# Altium footprint library ref-packages.PCBLIB: 1544 footprints (part 74 of 103)
Each footprint in its own frame and in the unit in brackets; x right, y up, seen from the top. Pads: shape width x height; smd on the part's side, far side on the other; paste and mask are expansions set on the pad; w line width, h text height; cw(c..) or ccw(c..) is an arc to the next point about the centre after c.
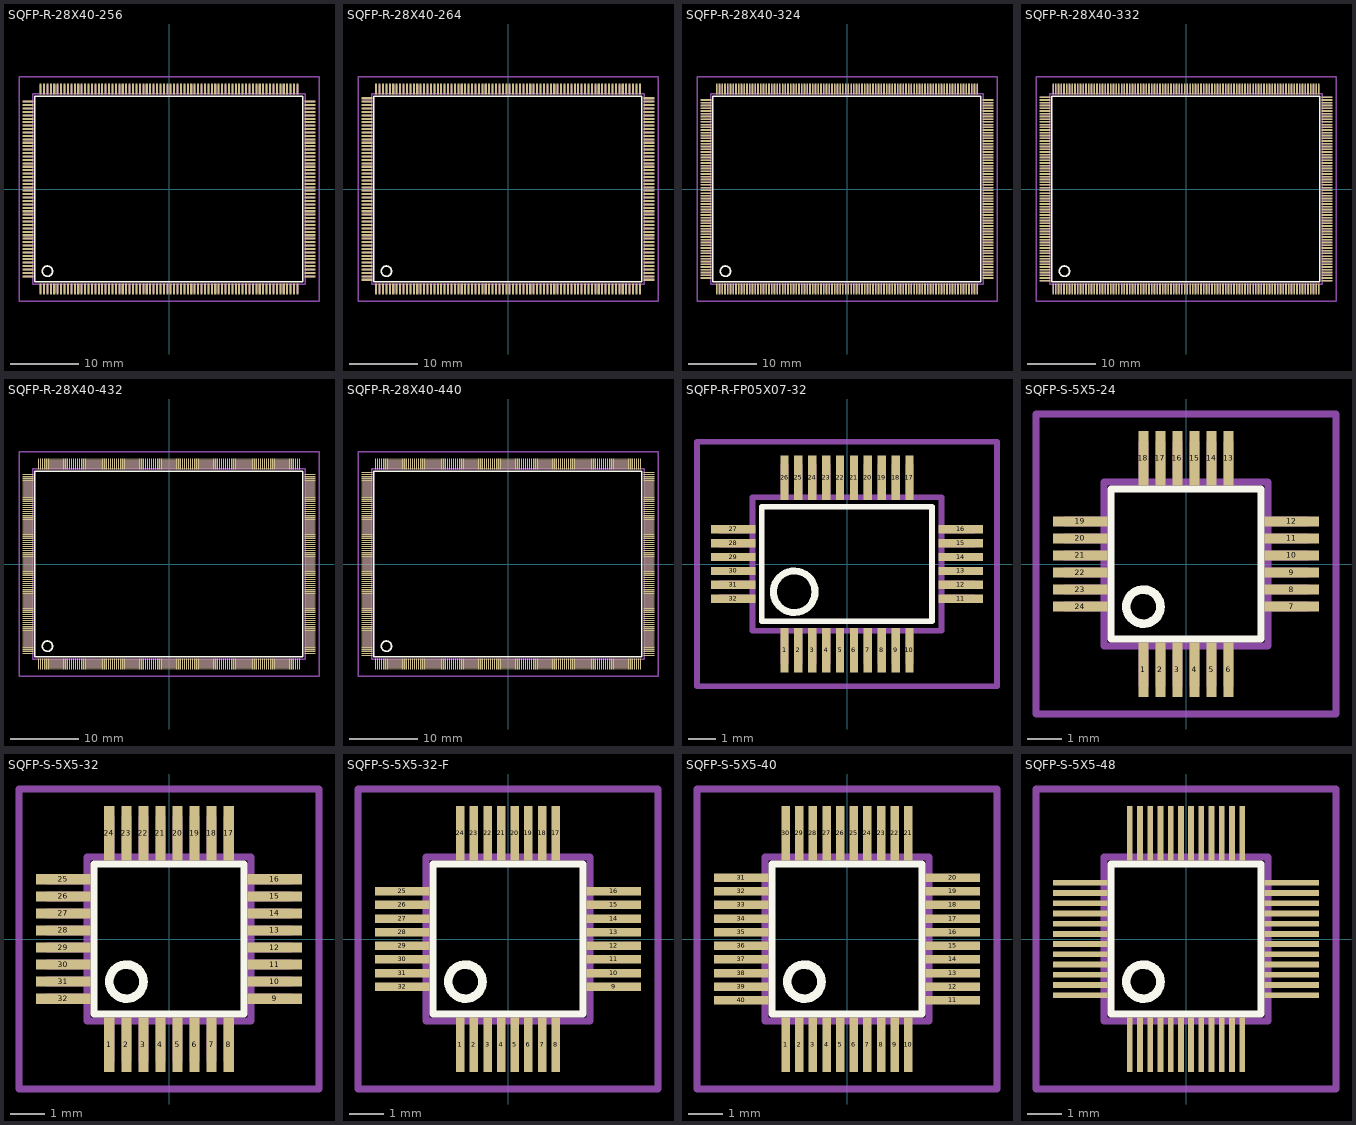
[diagram p73: the footprints below, top view; thin cyan lines are the x and y axes]

## SQFP-R-28X40-256 [mil]
pads (256):
  rect 11.81x62.99 smd: 1(-738.19,-574.8) 2(-718.5,-574.8) 3(-698.82,-574.8) 4(-679.13,-574.8) 5(-659.45,-574.8) 6(-639.76,-574.8) 7(-620.08,-574.8) 8(-600.39,-574.8) 9(-580.71,-574.8) 10(-561.02,-574.8) 11(-541.34,-574.8) 12(-521.65,-574.8) 13(-501.97,-574.8) 14(-482.28,-574.8) 15(-462.6,-574.8) 16(-442.91,-574.8) 17(-423.23,-574.8) 18(-403.54,-574.8) 19(-383.86,-574.8) 20(-364.17,-574.8) 21(-344.49,-574.8) 22(-324.8,-574.8) 23(-305.12,-574.8) 24(-285.43,-574.8) 25(-265.75,-574.8) 26(-246.06,-574.8) 27(-226.38,-574.8) 28(-206.69,-574.8) 29(-187.01,-574.8) 30(-167.32,-574.8) 31(-147.64,-574.8) 32(-127.95,-574.8) 33(-108.27,-574.8) 34(-88.58,-574.8) 35(-68.9,-574.8) 36(-49.21,-574.8) 37(-29.53,-574.8) 38(-9.84,-574.8) 39(9.84,-574.8) 40(29.53,-574.8) 41(49.21,-574.8) 42(68.9,-574.8) 43(88.58,-574.8) 44(108.27,-574.8) 45(127.95,-574.8) 46(147.64,-574.8) 47(167.32,-574.8) 48(187.01,-574.8) 49(206.69,-574.8) 50(226.38,-574.8) 51(246.06,-574.8) 52(265.75,-574.8) 53(285.43,-574.8) 54(305.12,-574.8) 55(324.8,-574.8) 56(344.49,-574.8) 57(364.17,-574.8) 58(383.86,-574.8) 59(403.54,-574.8) 60(423.23,-574.8) 61(442.91,-574.8) 62(462.6,-574.8) 63(482.28,-574.8) 64(501.97,-574.8) 65(521.65,-574.8) 66(541.34,-574.8) 67(561.02,-574.8) 68(580.71,-574.8) 69(600.39,-574.8) 70(620.08,-574.8) 71(639.76,-574.8) 72(659.45,-574.8) 73(679.13,-574.8) 74(698.82,-574.8) 75(718.5,-574.8) 76(738.19,-574.8) 129(738.19,574.8) 130(718.5,574.8) 131(698.82,574.8) 132(679.13,574.8) 133(659.45,574.8) 134(639.76,574.8) 135(620.08,574.8) 136(600.39,574.8) 137(580.71,574.8) 138(561.02,574.8) 139(541.34,574.8) 140(521.65,574.8) 141(501.97,574.8) 142(482.28,574.8) 143(462.6,574.8) 144(442.91,574.8) 145(423.23,574.8) 146(403.54,574.8) 147(383.86,574.8) 148(364.17,574.8) 149(344.49,574.8) 150(324.8,574.8) 151(305.12,574.8) 152(285.43,574.8) 153(265.75,574.8) 154(246.06,574.8) 155(226.38,574.8) 156(206.69,574.8) 157(187.01,574.8) 158(167.32,574.8) 159(147.64,574.8) 160(127.95,574.8) 161(108.27,574.8) 162(88.58,574.8) 163(68.9,574.8) 164(49.21,574.8) 165(29.53,574.8) 166(9.84,574.8) 167(-9.84,574.8) 168(-29.53,574.8) 169(-49.21,574.8) 170(-68.9,574.8) 171(-88.58,574.8) 172(-108.27,574.8) 173(-127.95,574.8) 174(-147.64,574.8) 175(-167.32,574.8) 176(-187.01,574.8) 177(-206.69,574.8) 178(-226.38,574.8) 179(-246.06,574.8) 180(-265.75,574.8) 181(-285.43,574.8) 182(-305.12,574.8) 183(-324.8,574.8) 184(-344.49,574.8) 185(-364.17,574.8) 186(-383.86,574.8) 187(-403.54,574.8) 188(-423.23,574.8) 189(-442.91,574.8) 190(-462.6,574.8) 191(-482.28,574.8) 192(-501.97,574.8) 193(-521.65,574.8) 194(-541.34,574.8) 195(-561.02,574.8) 196(-580.71,574.8) 197(-600.39,574.8) 198(-620.08,574.8) 199(-639.76,574.8) 200(-659.45,574.8) 201(-679.13,574.8) 202(-698.82,574.8) 203(-718.5,574.8) 204(-738.19,574.8)
  rect 62.99x11.81 smd: 77(811.02,-501.97) 78(811.02,-482.28) 79(811.02,-462.6) 80(811.02,-442.91) 81(811.02,-423.23) 82(811.02,-403.54) 83(811.02,-383.86) 84(811.02,-364.17) 85(811.02,-344.49) 86(811.02,-324.8) 87(811.02,-305.12) 88(811.02,-285.43) 89(811.02,-265.75) 90(811.02,-246.06) 91(811.02,-226.38) 92(811.02,-206.69) 93(811.02,-187.01) 94(811.02,-167.32) 95(811.02,-147.64) 96(811.02,-127.95) 97(811.02,-108.27) 98(811.02,-88.58) 99(811.02,-68.9) 100(811.02,-49.21) 101(811.02,-29.53) 102(811.02,-9.84) 103(811.02,9.84) 104(811.02,29.53) 105(811.02,49.21) 106(811.02,68.9) 107(811.02,88.58) 108(811.02,108.27) 109(811.02,127.95) 110(811.02,147.64) 111(811.02,167.32) 112(811.02,187.01) 113(811.02,206.69) 114(811.02,226.38) 115(811.02,246.06) 116(811.02,265.75) 117(811.02,285.43) 118(811.02,305.12) 119(811.02,324.8) 120(811.02,344.49) 121(811.02,364.17) 122(811.02,383.86) 123(811.02,403.54) 124(811.02,423.23) 125(811.02,442.91) 126(811.02,462.6) 127(811.02,482.28) 128(811.02,501.97) 205(-811.02,501.97) 206(-811.02,482.28) 207(-811.02,462.6) 208(-811.02,442.91) 209(-811.02,423.23) 210(-811.02,403.54) 211(-811.02,383.86) 212(-811.02,364.17) 213(-811.02,344.49) 214(-811.02,324.8) 215(-811.02,305.12) 216(-811.02,285.43) 217(-811.02,265.75) 218(-811.02,246.06) 219(-811.02,226.38) 220(-811.02,206.69) 221(-811.02,187.01) 222(-811.02,167.32) 223(-811.02,147.64) 224(-811.02,127.95) 225(-811.02,108.27) 226(-811.02,88.58) 227(-811.02,68.9) 228(-811.02,49.21) 229(-811.02,29.53) 230(-811.02,9.84) 231(-811.02,-9.84) 232(-811.02,-29.53) 233(-811.02,-49.21) 234(-811.02,-68.9) 235(-811.02,-88.58) 236(-811.02,-108.27) 237(-811.02,-127.95) 238(-811.02,-147.64) 239(-811.02,-167.32) 240(-811.02,-187.01) 241(-811.02,-206.69) 242(-811.02,-226.38) 243(-811.02,-246.06) 244(-811.02,-265.75) 245(-811.02,-285.43) 246(-811.02,-305.12) 247(-811.02,-324.8) 248(-811.02,-344.49) 249(-811.02,-364.17) 250(-811.02,-383.86) 251(-811.02,-403.54) 252(-811.02,-423.23) 253(-811.02,-442.91) 254(-811.02,-462.6) 255(-811.02,-482.28) 256(-811.02,-501.97)
Top Overlay:
  circle w10: c-698.82,-472.44 r29.53
  lines w8: -770.47,-533.86 770.08,-533.86 770.08,533.86 -770.47,533.86 -770.47,-533.86
Mechanical 16:
  drawing of 260 lines, arcs and shapes, not listed
Mechanical 27:
  lines w7.87: -862.2,-645.67 -862.2,645.67 862.2,645.67 862.2,-645.67 -862.2,-645.67

## SQFP-R-28X40-264 [mil]
pads (264):
  rect 11.81x62.99 smd: 1(-757.87,-574.8) 2(-738.19,-574.8) 3(-718.5,-574.8) 4(-698.82,-574.8) 5(-679.13,-574.8) 6(-659.45,-574.8) 7(-639.76,-574.8) 8(-620.08,-574.8) 9(-600.39,-574.8) 10(-580.71,-574.8) 11(-561.02,-574.8) 12(-541.34,-574.8) 13(-521.65,-574.8) 14(-501.97,-574.8) 15(-482.28,-574.8) 16(-462.6,-574.8) 17(-442.91,-574.8) 18(-423.23,-574.8) 19(-403.54,-574.8) 20(-383.86,-574.8) 21(-364.17,-574.8) 22(-344.49,-574.8) 23(-324.8,-574.8) 24(-305.12,-574.8) 25(-285.43,-574.8) 26(-265.75,-574.8) 27(-246.06,-574.8) 28(-226.38,-574.8) 29(-206.69,-574.8) 30(-187.01,-574.8) 31(-167.32,-574.8) 32(-147.64,-574.8) 33(-127.95,-574.8) 34(-108.27,-574.8) 35(-88.58,-574.8) 36(-68.9,-574.8) 37(-49.21,-574.8) 38(-29.53,-574.8) 39(-9.84,-574.8) 40(9.84,-574.8) 41(29.53,-574.8) 42(49.21,-574.8) 43(68.9,-574.8) 44(88.58,-574.8) 45(108.27,-574.8) 46(127.95,-574.8) 47(147.64,-574.8) 48(167.32,-574.8) 49(187.01,-574.8) 50(206.69,-574.8) 51(226.38,-574.8) 52(246.06,-574.8) 53(265.75,-574.8) 54(285.43,-574.8) 55(305.12,-574.8) 56(324.8,-574.8) 57(344.49,-574.8) 58(364.17,-574.8) 59(383.86,-574.8) 60(403.54,-574.8) 61(423.23,-574.8) 62(442.91,-574.8) 63(462.6,-574.8) 64(482.28,-574.8) 65(501.97,-574.8) 66(521.65,-574.8) 67(541.34,-574.8) 68(561.02,-574.8) 69(580.71,-574.8) 70(600.39,-574.8) 71(620.08,-574.8) 72(639.76,-574.8) 73(659.45,-574.8) 74(679.13,-574.8) 75(698.82,-574.8) 76(718.5,-574.8) 77(738.19,-574.8) 78(757.87,-574.8) 133(757.87,574.8) 134(738.19,574.8) 135(718.5,574.8) 136(698.82,574.8) 137(679.13,574.8) 138(659.45,574.8) 139(639.76,574.8) 140(620.08,574.8) 141(600.39,574.8) 142(580.71,574.8) 143(561.02,574.8) 144(541.34,574.8) 145(521.65,574.8) 146(501.97,574.8) 147(482.28,574.8) 148(462.6,574.8) 149(442.91,574.8) 150(423.23,574.8) 151(403.54,574.8) 152(383.86,574.8) 153(364.17,574.8) 154(344.49,574.8) 155(324.8,574.8) 156(305.12,574.8) 157(285.43,574.8) 158(265.75,574.8) 159(246.06,574.8) 160(226.38,574.8) 161(206.69,574.8) 162(187.01,574.8) 163(167.32,574.8) 164(147.64,574.8) 165(127.95,574.8) 166(108.27,574.8) 167(88.58,574.8) 168(68.9,574.8) 169(49.21,574.8) 170(29.53,574.8) 171(9.84,574.8) 172(-9.84,574.8) 173(-29.53,574.8) 174(-49.21,574.8) 175(-68.9,574.8) 176(-88.58,574.8) 177(-108.27,574.8) 178(-127.95,574.8) 179(-147.64,574.8) 180(-167.32,574.8) 181(-187.01,574.8) 182(-206.69,574.8) 183(-226.38,574.8) 184(-246.06,574.8) 185(-265.75,574.8) 186(-285.43,574.8) 187(-305.12,574.8) 188(-324.8,574.8) 189(-344.49,574.8) 190(-364.17,574.8) 191(-383.86,574.8) 192(-403.54,574.8) 193(-423.23,574.8) 194(-442.91,574.8) 195(-462.6,574.8) 196(-482.28,574.8) 197(-501.97,574.8) 198(-521.65,574.8) 199(-541.34,574.8) 200(-561.02,574.8) 201(-580.71,574.8) 202(-600.39,574.8) 203(-620.08,574.8) 204(-639.76,574.8) 205(-659.45,574.8) 206(-679.13,574.8) 207(-698.82,574.8) 208(-718.5,574.8) 209(-738.19,574.8) 210(-757.87,574.8)
  rect 62.99x11.81 smd: 79(811.02,-521.65) 80(811.02,-501.97) 81(811.02,-482.28) 82(811.02,-462.6) 83(811.02,-442.91) 84(811.02,-423.23) 85(811.02,-403.54) 86(811.02,-383.86) 87(811.02,-364.17) 88(811.02,-344.49) 89(811.02,-324.8) 90(811.02,-305.12) 91(811.02,-285.43) 92(811.02,-265.75) 93(811.02,-246.06) 94(811.02,-226.38) 95(811.02,-206.69) 96(811.02,-187.01) 97(811.02,-167.32) 98(811.02,-147.64) 99(811.02,-127.95) 100(811.02,-108.27) 101(811.02,-88.58) 102(811.02,-68.9) 103(811.02,-49.21) 104(811.02,-29.53) 105(811.02,-9.84) 106(811.02,9.84) 107(811.02,29.53) 108(811.02,49.21) 109(811.02,68.9) 110(811.02,88.58) 111(811.02,108.27) 112(811.02,127.95) 113(811.02,147.64) 114(811.02,167.32) 115(811.02,187.01) 116(811.02,206.69) 117(811.02,226.38) 118(811.02,246.06) 119(811.02,265.75) 120(811.02,285.43) 121(811.02,305.12) 122(811.02,324.8) 123(811.02,344.49) 124(811.02,364.17) 125(811.02,383.86) 126(811.02,403.54) 127(811.02,423.23) 128(811.02,442.91) 129(811.02,462.6) 130(811.02,482.28) 131(811.02,501.97) 132(811.02,521.65) 211(-811.02,521.65) 212(-811.02,501.97) 213(-811.02,482.28) 214(-811.02,462.6) 215(-811.02,442.91) 216(-811.02,423.23) 217(-811.02,403.54) 218(-811.02,383.86) 219(-811.02,364.17) 220(-811.02,344.49) 221(-811.02,324.8) 222(-811.02,305.12) 223(-811.02,285.43) 224(-811.02,265.75) 225(-811.02,246.06) 226(-811.02,226.38) 227(-811.02,206.69) 228(-811.02,187.01) 229(-811.02,167.32) 230(-811.02,147.64) 231(-811.02,127.95) 232(-811.02,108.27) 233(-811.02,88.58) 234(-811.02,68.9) 235(-811.02,49.21) 236(-811.02,29.53) 237(-811.02,9.84) 238(-811.02,-9.84) 239(-811.02,-29.53) 240(-811.02,-49.21) 241(-811.02,-68.9) 242(-811.02,-88.58) 243(-811.02,-108.27) 244(-811.02,-127.95) 245(-811.02,-147.64) 246(-811.02,-167.32) 247(-811.02,-187.01) 248(-811.02,-206.69) 249(-811.02,-226.38) 250(-811.02,-246.06) 251(-811.02,-265.75) 252(-811.02,-285.43) 253(-811.02,-305.12) 254(-811.02,-324.8) 255(-811.02,-344.49) 256(-811.02,-364.17) 257(-811.02,-383.86) 258(-811.02,-403.54) 259(-811.02,-423.23) 260(-811.02,-442.91) 261(-811.02,-462.6) 262(-811.02,-482.28) 263(-811.02,-501.97) 264(-811.02,-521.65)
Top Overlay:
  circle w10: c-698.82,-472.44 r29.53
  lines w8: -770.47,-533.86 770.08,-533.86 770.08,533.86 -770.47,533.86 -770.47,-533.86
Mechanical 16:
  drawing of 268 lines, arcs and shapes, not listed
Mechanical 27:
  lines w7.87: -862.2,-645.67 -862.2,645.67 862.2,645.67 862.2,-645.67 -862.2,-645.67

## SQFP-R-28X40-324 [mm]
pads (324):
  rect 0.25x1.6 smd: 1(-19,-14.6) 2(-18.6,-14.6) 3(-18.2,-14.6) 4(-17.8,-14.6) 5(-17.4,-14.6) 6(-17,-14.6) 7(-16.6,-14.6) 8(-16.2,-14.6) 9(-15.8,-14.6) 10(-15.4,-14.6) 11(-15,-14.6) 12(-14.6,-14.6) 13(-14.2,-14.6) 14(-13.8,-14.6) 15(-13.4,-14.6) 16(-13,-14.6) 17(-12.6,-14.6) 18(-12.2,-14.6) 19(-11.8,-14.6) 20(-11.4,-14.6) 21(-11,-14.6) 22(-10.6,-14.6) 23(-10.2,-14.6) 24(-9.8,-14.6) 25(-9.4,-14.6) 26(-9,-14.6) 27(-8.6,-14.6) 28(-8.2,-14.6) 29(-7.8,-14.6) 30(-7.4,-14.6) 31(-4.6,-14.6) 32(-7,-14.6) 33(-6.6,-14.6) 34(-6.2,-14.6) 35(-5.8,-14.6) 36(-5.4,-14.6) 37(-5,-14.6) 38(-4.2,-14.6) 39(-3.8,-14.6) 40(-3.4,-14.6) 41(-3,-14.6) 42(-2.6,-14.6) 43(-2.2,-14.6) 44(-1.8,-14.6) 45(-1.4,-14.6) 46(-1,-14.6) 47(-0.6,-14.6) 48(-0.2,-14.6) 49(0.2,-14.6) 50(0.6,-14.6) 51(1,-14.6) 52(1.4,-14.6) 53(1.8,-14.6) 54(2.2,-14.6) 55(2.6,-14.6) 56(3,-14.6) 57(3.4,-14.6) 58(3.8,-14.6) 59(4.2,-14.6) 60(4.6,-14.6) 61(5,-14.6) 62(5.4,-14.6) 63(5.8,-14.6) 64(6.2,-14.6) 65(6.6,-14.6) 66(7,-14.6) 67(7.4,-14.6) 68(7.8,-14.6) 69(8.2,-14.6) 70(8.6,-14.6) 71(9,-14.6) 72(9.4,-14.6) 73(9.8,-14.6) 74(10.2,-14.6) 75(10.6,-14.6) 76(11,-14.6) 77(11.4,-14.6) 78(11.8,-14.6) 79(12.2,-14.6) 80(12.6,-14.6) 81(13,-14.6) 82(13.4,-14.6) 83(13.8,-14.6) 84(14.2,-14.6) 85(14.6,-14.6) 86(15,-14.6) 87(15.4,-14.6) 88(15.8,-14.6) 89(16.2,-14.6) 90(16.6,-14.6) 91(17,-14.6) 92(17.4,-14.6) 93(17.8,-14.6) 94(18.2,-14.6) 95(18.6,-14.6) 96(19,-14.6) 163(19,14.6) 164(18.6,14.6) 165(18.2,14.6) 166(17.8,14.6) 167(17.4,14.6) 168(17,14.6) 169(16.6,14.6) 170(16.2,14.6) 171(15.8,14.6) 172(15.4,14.6) 173(15,14.6) 174(14.6,14.6) 175(14.2,14.6) 176(13.8,14.6) 177(13.4,14.6) 178(13,14.6) 179(12.6,14.6) 180(12.2,14.6) 181(11.8,14.6) 182(11.4,14.6) 183(11,14.6) 184(10.6,14.6) 185(10.2,14.6) 186(9.8,14.6) 187(9.4,14.6) 188(9,14.6) 189(8.6,14.6) 190(8.2,14.6) 191(7.8,14.6) 192(7.4,14.6) 193(7,14.6) 194(6.6,14.6) 195(6.2,14.6) 196(5.8,14.6) 197(5.4,14.6) 198(5,14.6) 199(4.6,14.6) 200(4.2,14.6) 201(3.8,14.6) 202(3.4,14.6) 203(3,14.6) 204(2.6,14.6) 205(2.2,14.6) 206(1.8,14.6) 207(1.4,14.6) 208(1,14.6) 209(0.6,14.6) 210(0.2,14.6) 211(-0.2,14.6) 212(-0.6,14.6) 213(-1,14.6) 214(-1.4,14.6) 215(-1.8,14.6) 216(-2.2,14.6) 217(-2.6,14.6) 218(-3,14.6) 219(-3.4,14.6) 220(-3.8,14.6) 221(-4.2,14.6) 222(-4.6,14.6) 223(-5,14.6) 224(-5.4,14.6) 225(-5.8,14.6) 226(-6.2,14.6) 227(-6.6,14.6) 228(-7,14.6) 229(-7.4,14.6) 230(-7.8,14.6) 231(-8.2,14.6) 232(-8.6,14.6) 233(-9,14.6) 234(-9.4,14.6) 235(-9.8,14.6) 236(-10.2,14.6) 237(-10.6,14.6) 238(-11,14.6) 239(-11.4,14.6) 240(-11.8,14.6) 241(-12.2,14.6) 242(-12.6,14.6) 243(-13,14.6) 244(-13.4,14.6) 245(-13.8,14.6) 246(-14.2,14.6) 247(-14.6,14.6) 248(-15,14.6) 249(-15.4,14.6) 250(-15.8,14.6) 251(-16.2,14.6) 252(-16.6,14.6) 253(-17,14.6) 254(-17.4,14.6) 255(-17.8,14.6) 256(-18.2,14.6) 257(-18.6,14.6) 258(-19,14.6)
  rect 1.6x0.25 smd: 97(20.6,-13) 98(20.6,-12.6) 99(20.6,-12.2) 100(20.6,-11.8) 101(20.6,-11.4) 102(20.6,-11) 103(20.6,-10.6) 104(20.6,-10.2) 105(20.6,-9.8) 106(20.6,-9.4) 107(20.6,-9) 108(20.6,-8.6) 109(20.6,-8.2) 110(20.6,-7.8) 111(20.6,-7.4) 112(20.6,-7) 113(20.6,-6.6) 114(20.6,-6.2) 115(20.6,-5.8) 116(20.6,-5.4) 117(20.6,-5) 118(20.6,-4.6) 119(20.6,-4.2) 120(20.6,-3.8) 121(20.6,-3.4) 122(20.6,-3) 123(20.6,-2.6) 124(20.6,-2.2) 125(20.6,-1.8) 126(20.6,-1.4) 127(20.6,-1) 128(20.6,-0.6) 129(20.6,-0.2) 130(20.6,0.2) 131(20.6,0.6) 132(20.6,1) 133(20.6,1.4) 134(20.6,1.8) 135(20.6,2.2) 136(20.6,2.6) 137(20.6,3) 138(20.6,3.4) 139(20.6,3.8) 140(20.6,4.2) 141(20.6,4.6) 142(20.6,5) 143(20.6,5.4) 144(20.6,5.8) 145(20.6,6.2) 146(20.6,6.6) 147(20.6,7) 148(20.6,7.4) 149(20.6,7.8) 150(20.6,8.2) 151(20.6,8.6) 152(20.6,9) 153(20.6,9.4) 154(20.6,9.8) 155(20.6,10.2) 156(20.6,10.6) 157(20.6,11) 158(20.6,11.4) 159(20.6,11.8) 160(20.6,12.2) 161(20.6,12.6) 162(20.6,13) 259(-20.6,13) 260(-20.6,12.6) 261(-20.6,12.2) 262(-20.6,11.8) 263(-20.6,11.4) 264(-20.6,11) 265(-20.6,10.6) 266(-20.6,10.2) 267(-20.6,9.8) 268(-20.6,9.4) 269(-20.6,9) 270(-20.6,8.6) 271(-20.6,8.2) 272(-20.6,7.8) 273(-20.6,7.4) 274(-20.6,7) 275(-20.6,6.6) 276(-20.6,6.2) 277(-20.6,5.8) 278(-20.6,5.4) 279(-20.6,5) 280(-20.6,4.6) 281(-20.6,4.2) 282(-20.6,3.8) 283(-20.6,3.4) 284(-20.6,3) 285(-20.6,2.6) 286(-20.6,2.2) 287(-20.6,1.8) 288(-20.6,1.4) 289(-20.6,1) 290(-20.6,0.6) 291(-20.6,0.2) 292(-20.6,-0.2) 293(-20.6,-0.6) 294(-20.6,-1) 295(-20.6,-1.4) 296(-20.6,-1.8) 297(-20.6,-2.2) 298(-20.6,-2.6) 299(-20.6,-3) 300(-20.6,-3.4) 301(-20.6,-3.8) 302(-20.6,-4.2) 303(-20.6,-4.6) 304(-20.6,-5) 305(-20.6,-5.4) 306(-20.6,-5.8) 307(-20.6,-6.2) 308(-20.6,-6.6) 309(-20.6,-7) 310(-20.6,-7.4) 311(-20.6,-7.8) 312(-20.6,-8.2) 313(-20.6,-8.6) 314(-20.6,-9) 315(-20.6,-9.4) 316(-20.6,-9.8) 317(-20.6,-10.2) 318(-20.6,-10.6) 319(-20.6,-11) 320(-20.6,-11.4) 321(-20.6,-11.8) 322(-20.6,-12.2) 323(-20.6,-12.6) 324(-20.6,-13)
Top Overlay:
  circle w0.254: c-17.75,-12 r0.75
  lines w0.203: -19.57,-13.56 19.56,-13.56 19.56,13.56 -19.57,13.56 -19.57,-13.56
Mechanical 16:
  drawing of 328 lines, arcs and shapes, not listed
Mechanical 27:
  lines w0.2: -21.9,-16.4 -21.9,16.4 21.9,16.4 21.9,-16.4 -21.9,-16.4

## SQFP-R-28X40-332 [mm]
pads (332):
  rect 0.25x1.6 smd: 1(-19.4,-14.6) 2(-19,-14.6) 3(-18.6,-14.6) 4(-18.2,-14.6) 5(-17.8,-14.6) 6(-17.4,-14.6) 7(-17,-14.6) 8(-16.6,-14.6) 9(-16.2,-14.6) 10(-15.8,-14.6) 11(-15.4,-14.6) 12(-15,-14.6) 13(-14.6,-14.6) 14(-14.2,-14.6) 15(-13.8,-14.6) 16(-13.4,-14.6) 17(-13,-14.6) 18(-12.6,-14.6) 19(-12.2,-14.6) 20(-11.8,-14.6) 21(-11.4,-14.6) 22(-11,-14.6) 23(-10.6,-14.6) 24(-10.2,-14.6) 25(-9.8,-14.6) 26(-9.4,-14.6) 27(-9,-14.6) 28(-8.6,-14.6) 29(-8.2,-14.6) 30(-7.8,-14.6) 31(-5,-14.6) 32(-7.4,-14.6) 33(-7,-14.6) 34(-6.6,-14.6) 35(-6.2,-14.6) 36(-5.8,-14.6) 37(-5.4,-14.6) 38(-4.6,-14.6) 39(-4.2,-14.6) 40(-3.8,-14.6) 41(-3.4,-14.6) 42(-3,-14.6) 43(-2.6,-14.6) 44(-2.2,-14.6) 45(-1.8,-14.6) 46(-1.4,-14.6) 47(-1,-14.6) 48(-0.6,-14.6) 49(-0.2,-14.6) 50(0.2,-14.6) 51(0.6,-14.6) 52(1,-14.6) 53(1.4,-14.6) 54(1.8,-14.6) 55(2.2,-14.6) 56(2.6,-14.6) 57(3,-14.6) 58(3.4,-14.6) 59(3.8,-14.6) 60(4.2,-14.6) 61(4.6,-14.6) 62(5,-14.6) 63(5.4,-14.6) 64(5.8,-14.6) 65(6.2,-14.6) 66(6.6,-14.6) 67(7,-14.6) 68(7.4,-14.6) 69(7.8,-14.6) 70(8.2,-14.6) 71(8.6,-14.6) 72(9,-14.6) 73(9.4,-14.6) 74(9.8,-14.6) 75(10.2,-14.6) 76(10.6,-14.6) 77(11,-14.6) 78(11.4,-14.6) 79(11.8,-14.6) 80(12.2,-14.6) 81(12.6,-14.6) 82(13,-14.6) 83(13.4,-14.6) 84(13.8,-14.6) 85(14.2,-14.6) 86(14.6,-14.6) 87(15,-14.6) 88(15.4,-14.6) 89(15.8,-14.6) 90(16.2,-14.6) 91(16.6,-14.6) 92(17,-14.6) 93(17.4,-14.6) 94(17.8,-14.6) 95(18.2,-14.6) 96(18.6,-14.6) 97(19,-14.6) 98(19.4,-14.6) 167(19.4,14.6) 168(19,14.6) 169(18.6,14.6) 170(18.2,14.6) 171(17.8,14.6) 172(17.4,14.6) 173(17,14.6) 174(16.6,14.6) 175(16.2,14.6) 176(15.8,14.6) 177(15.4,14.6) 178(15,14.6) 179(14.6,14.6) 180(14.2,14.6) 181(13.8,14.6) 182(13.4,14.6) 183(13,14.6) 184(12.6,14.6) 185(12.2,14.6) 186(11.8,14.6) 187(11.4,14.6) 188(11,14.6) 189(10.6,14.6) 190(10.2,14.6) 191(9.8,14.6) 192(9.4,14.6) 193(9,14.6) 194(8.6,14.6) 195(8.2,14.6) 196(7.8,14.6) 197(7.4,14.6) 198(7,14.6) 199(6.6,14.6) 200(6.2,14.6) 201(5.8,14.6) 202(5.4,14.6) 203(5,14.6) 204(4.6,14.6) 205(4.2,14.6) 206(3.8,14.6) 207(3.4,14.6) 208(3,14.6) 209(2.6,14.6) 210(2.2,14.6) 211(1.8,14.6) 212(1.4,14.6) 213(1,14.6) 214(0.6,14.6) 215(0.2,14.6) 216(-0.2,14.6) 217(-0.6,14.6) 218(-1,14.6) 219(-1.4,14.6) 220(-1.8,14.6) 221(-2.2,14.6) 222(-2.6,14.6) 223(-3,14.6) 224(-3.4,14.6) 225(-3.8,14.6) 226(-4.2,14.6) 227(-4.6,14.6) 228(-5,14.6) 229(-5.4,14.6) 230(-5.8,14.6) 231(-6.2,14.6) 232(-6.6,14.6) 233(-7,14.6) 234(-7.4,14.6) 235(-7.8,14.6) 236(-8.2,14.6) 237(-8.6,14.6) 238(-9,14.6) 239(-9.4,14.6) 240(-9.8,14.6) 241(-10.2,14.6) 242(-10.6,14.6) 243(-11,14.6) 244(-11.4,14.6) 245(-11.8,14.6) 246(-12.2,14.6) 247(-12.6,14.6) 248(-13,14.6) 249(-13.4,14.6) 250(-13.8,14.6) 251(-14.2,14.6) 252(-14.6,14.6) 253(-15,14.6) 254(-15.4,14.6) 255(-15.8,14.6) 256(-16.2,14.6) 257(-16.6,14.6) 258(-17,14.6) 259(-17.4,14.6) 260(-17.8,14.6) 261(-18.2,14.6) 262(-18.6,14.6) 263(-19,14.6) 264(-19.4,14.6)
  rect 1.6x0.25 smd: 99(20.6,-13.4) 100(20.6,-13) 101(20.6,-12.6) 102(20.6,-12.2) 103(20.6,-11.8) 104(20.6,-11.4) 105(20.6,-11) 106(20.6,-10.6) 107(20.6,-10.2) 108(20.6,-9.8) 109(20.6,-9.4) 110(20.6,-9) 111(20.6,-8.6) 112(20.6,-8.2) 113(20.6,-7.8) 114(20.6,-7.4) 115(20.6,-7) 116(20.6,-6.6) 117(20.6,-6.2) 118(20.6,-5.8) 119(20.6,-5.4) 120(20.6,-5) 121(20.6,-4.6) 122(20.6,-4.2) 123(20.6,-3.8) 124(20.6,-3.4) 125(20.6,-3) 126(20.6,-2.6) 127(20.6,-2.2) 128(20.6,-1.8) 129(20.6,-1.4) 130(20.6,-1) 131(20.6,-0.6) 132(20.6,-0.2) 133(20.6,0.2) 134(20.6,0.6) 135(20.6,1) 136(20.6,1.4) 137(20.6,1.8) 138(20.6,2.2) 139(20.6,2.6) 140(20.6,3) 141(20.6,3.4) 142(20.6,3.8) 143(20.6,4.2) 144(20.6,4.6) 145(20.6,5) 146(20.6,5.4) 147(20.6,5.8) 148(20.6,6.2) 149(20.6,6.6) 150(20.6,7) 151(20.6,7.4) 152(20.6,7.8) 153(20.6,8.2) 154(20.6,8.6) 155(20.6,9) 156(20.6,9.4) 157(20.6,9.8) 158(20.6,10.2) 159(20.6,10.6) 160(20.6,11) 161(20.6,11.4) 162(20.6,11.8) 163(20.6,12.2) 164(20.6,12.6) 165(20.6,13) 166(20.6,13.4) 265(-20.6,13.4) 266(-20.6,13) 267(-20.6,12.6) 268(-20.6,12.2) 269(-20.6,11.8) 270(-20.6,11.4) 271(-20.6,11) 272(-20.6,10.6) 273(-20.6,10.2) 274(-20.6,9.8) 275(-20.6,9.4) 276(-20.6,9) 277(-20.6,8.6) 278(-20.6,8.2) 279(-20.6,7.8) 280(-20.6,7.4) 281(-20.6,7) 282(-20.6,6.6) 283(-20.6,6.2) 284(-20.6,5.8) 285(-20.6,5.4) 286(-20.6,5) 287(-20.6,4.6) 288(-20.6,4.2) 289(-20.6,3.8) 290(-20.6,3.4) 291(-20.6,3) 292(-20.6,2.6) 293(-20.6,2.2) 294(-20.6,1.8) 295(-20.6,1.4) 296(-20.6,1) 297(-20.6,0.6) 298(-20.6,0.2) 299(-20.6,-0.2) 300(-20.6,-0.6) 301(-20.6,-1) 302(-20.6,-1.4) 303(-20.6,-1.8) 304(-20.6,-2.2) 305(-20.6,-2.6) 306(-20.6,-3) 307(-20.6,-3.4) 308(-20.6,-3.8) 309(-20.6,-4.2) 310(-20.6,-4.6) 311(-20.6,-5) 312(-20.6,-5.4) 313(-20.6,-5.8) 314(-20.6,-6.2) 315(-20.6,-6.6) 316(-20.6,-7) 317(-20.6,-7.4) 318(-20.6,-7.8) 319(-20.6,-8.2) 320(-20.6,-8.6) 321(-20.6,-9) 322(-20.6,-9.4) 323(-20.6,-9.8) 324(-20.6,-10.2) 325(-20.6,-10.6) 326(-20.6,-11) 327(-20.6,-11.4) 328(-20.6,-11.8) 329(-20.6,-12.2) 330(-20.6,-12.6) 331(-20.6,-13) 332(-20.6,-13.4)
Top Overlay:
  circle w0.254: c-17.75,-12 r0.75
  lines w0.203: -19.57,-13.56 19.56,-13.56 19.56,13.56 -19.57,13.56 -19.57,-13.56
Mechanical 16:
  drawing of 336 lines, arcs and shapes, not listed
Mechanical 27:
  lines w0.2: -21.9,-16.4 -21.9,16.4 21.9,16.4 21.9,-16.4 -21.9,-16.4

## SQFP-R-28X40-432 [mm]
pads (432):
  rect 0.17x1.6 smd: 1(-19.05,-14.6) 2(-18.75,-14.6) 3(-18.45,-14.6) 4(-18.15,-14.6) 5(-17.85,-14.6) 6(-17.55,-14.6) 7(-17.25,-14.6) 8(-16.95,-14.6) 9(-16.65,-14.6) 10(-16.35,-14.6) 11(-16.05,-14.6) 12(-15.75,-14.6) 13(-15.45,-14.6) 14(-15.15,-14.6) 15(-14.85,-14.6) 16(-14.55,-14.6) 17(-14.25,-14.6) 18(-13.95,-14.6) 19(-13.65,-14.6) 20(-13.35,-14.6) 21(-13.05,-14.6) 22(-12.75,-14.6) 23(-12.45,-14.6) 24(-12.15,-14.6) 25(-11.85,-14.6) 26(-11.55,-14.6) 27(-11.25,-14.6) 28(-10.95,-14.6) 29(-10.65,-14.6) 30(-10.35,-14.6) 31(-10.05,-14.6) 32(-9.75,-14.6) 33(-9.45,-14.6) 34(-9.15,-14.6) 35(-8.85,-14.6) 36(-8.55,-14.6) 37(-8.25,-14.6) 38(-7.95,-14.6) 39(-7.65,-14.6) 40(-7.35,-14.6) 41(-7.05,-14.6) 42(-6.75,-14.6) 43(-6.45,-14.6) 44(-6.15,-14.6) 45(-5.85,-14.6) 46(-5.55,-14.6) 47(-5.25,-14.6) 48(-4.95,-14.6) 49(-4.65,-14.6) 50(-4.35,-14.6) 51(-4.05,-14.6) 52(-3.75,-14.6) 53(-3.45,-14.6) 54(-3.15,-14.6) 55(-2.85,-14.6) 56(-2.55,-14.6) 57(-2.25,-14.6) 58(-1.95,-14.6) 59(-1.65,-14.6) 60(-1.35,-14.6) 61(-1.05,-14.6) 62(-0.75,-14.6) 63(-0.45,-14.6) 64(-0.15,-14.6) 65(0.15,-14.6) 66(0.45,-14.6) 67(0.75,-14.6) 68(1.05,-14.6) 69(1.35,-14.6) 70(1.65,-14.6) 71(1.95,-14.6) 72(2.25,-14.6) 73(2.55,-14.6) 74(2.85,-14.6) 75(3.15,-14.6) 76(3.45,-14.6) 77(3.75,-14.6) 78(4.05,-14.6) 79(4.35,-14.6) 80(4.65,-14.6) 81(4.95,-14.6) 82(5.25,-14.6) 83(5.55,-14.6) 84(5.85,-14.6) 85(6.15,-14.6) 86(6.45,-14.6) 87(6.75,-14.6) 88(7.05,-14.6) 89(7.35,-14.6) 90(7.65,-14.6) 91(7.95,-14.6) 92(8.25,-14.6) 93(8.55,-14.6) 94(8.85,-14.6) 95(9.15,-14.6) 96(9.45,-14.6) 97(9.75,-14.6) 98(10.05,-14.6) 99(10.35,-14.6) 100(10.65,-14.6) 101(10.95,-14.6) 102(11.25,-14.6) 103(11.55,-14.6) 104(11.85,-14.6) 105(12.15,-14.6) 106(12.45,-14.6) 107(12.75,-14.6) 108(13.05,-14.6) 109(13.35,-14.6) 110(13.65,-14.6) 111(13.95,-14.6) 112(14.25,-14.6) 113(14.55,-14.6) 114(14.85,-14.6) 115(15.15,-14.6) 116(15.45,-14.6) 117(15.75,-14.6) 118(16.05,-14.6) 119(16.35,-14.6) 120(16.65,-14.6) 121(16.95,-14.6) 122(17.25,-14.6) 123(17.55,-14.6) 124(17.85,-14.6) 125(18.15,-14.6) 126(18.45,-14.6) 127(18.75,-14.6) 128(19.05,-14.6) 217(19.05,14.6) 218(18.75,14.6) 219(18.45,14.6) 220(18.15,14.6) 221(17.85,14.6) 222(17.55,14.6) 223(17.25,14.6) 224(16.95,14.6) 225(16.65,14.6) 226(16.35,14.6) 227(16.05,14.6) 228(15.75,14.6) 229(15.45,14.6) 230(15.15,14.6) 231(14.85,14.6) 232(14.55,14.6) 233(14.25,14.6) 234(13.95,14.6) 235(13.65,14.6) 236(13.35,14.6) 237(13.05,14.6) 238(12.75,14.6) 239(12.45,14.6) 240(12.15,14.6) 241(11.85,14.6) 242(11.55,14.6) 243(11.25,14.6) 244(10.95,14.6) 245(10.65,14.6) 246(10.35,14.6) 247(10.05,14.6) 248(9.75,14.6) 249(9.45,14.6) 250(9.15,14.6) 251(8.85,14.6) 252(8.55,14.6) 253(8.25,14.6) 254(7.95,14.6) 255(7.65,14.6) 256(7.35,14.6) 257(7.05,14.6) 258(6.75,14.6) 259(6.45,14.6) 260(6.15,14.6) 261(5.85,14.6) 262(5.55,14.6) 263(5.25,14.6) 264(4.95,14.6) 265(4.65,14.6) 266(4.35,14.6) 267(4.05,14.6) 268(3.75,14.6) 269(3.45,14.6) 270(3.15,14.6) 271(2.85,14.6) 272(2.55,14.6) 273(2.25,14.6) 274(1.95,14.6) 275(1.65,14.6) 276(1.35,14.6) 277(1.05,14.6) 278(0.75,14.6) 279(0.45,14.6) 280(0.15,14.6) 281(-0.15,14.6) 282(-0.45,14.6) 283(-0.75,14.6) 284(-1.05,14.6) 285(-1.35,14.6) 286(-1.65,14.6) 287(-1.95,14.6) 288(-2.25,14.6) 289(-2.55,14.6) 290(-2.85,14.6) 291(-3.15,14.6) 292(-3.45,14.6) 293(-3.75,14.6) 294(-4.05,14.6) 295(-4.35,14.6) 296(-4.65,14.6) 297(-4.95,14.6) 298(-5.25,14.6) 299(-5.55,14.6) 300(-5.85,14.6) 301(-6.15,14.6) 302(-6.45,14.6) 303(-6.75,14.6) 304(-7.05,14.6) 305(-7.35,14.6) 306(-7.65,14.6) 307(-7.95,14.6) 308(-8.25,14.6) 309(-8.55,14.6) 310(-8.85,14.6) 311(-9.15,14.6) 312(-9.45,14.6) 313(-9.75,14.6) 314(-10.05,14.6) 315(-10.35,14.6) 316(-10.65,14.6) 317(-10.95,14.6) 318(-11.25,14.6) 319(-11.55,14.6) 320(-11.85,14.6) 321(-12.15,14.6) 322(-12.45,14.6) 323(-12.75,14.6) 324(-13.05,14.6) 325(-13.35,14.6) 326(-13.65,14.6) 327(-13.95,14.6) 328(-14.25,14.6) 329(-14.55,14.6) 330(-14.85,14.6) 331(-15.15,14.6) 332(-15.45,14.6) 333(-15.75,14.6) 334(-16.05,14.6) 335(-16.35,14.6) 336(-16.65,14.6) 337(-16.95,14.6) 338(-17.25,14.6) 339(-17.55,14.6) 340(-17.85,14.6) 341(-18.15,14.6) 342(-18.45,14.6) 343(-18.75,14.6) 344(-19.05,14.6)